# Altium footprint library microbuilder.PCBLIB: 422 footprints (part 5 of 27)
Each footprint in its own frame and in the unit in brackets; x right, y up, seen from the top. Pads: shape width x height; smd on the part's side, far side on the other; paste and mask are expansions set on the pad; w line width, h text height; cw(c..) or ccw(c..) is an arc to the next point about the centre after c.
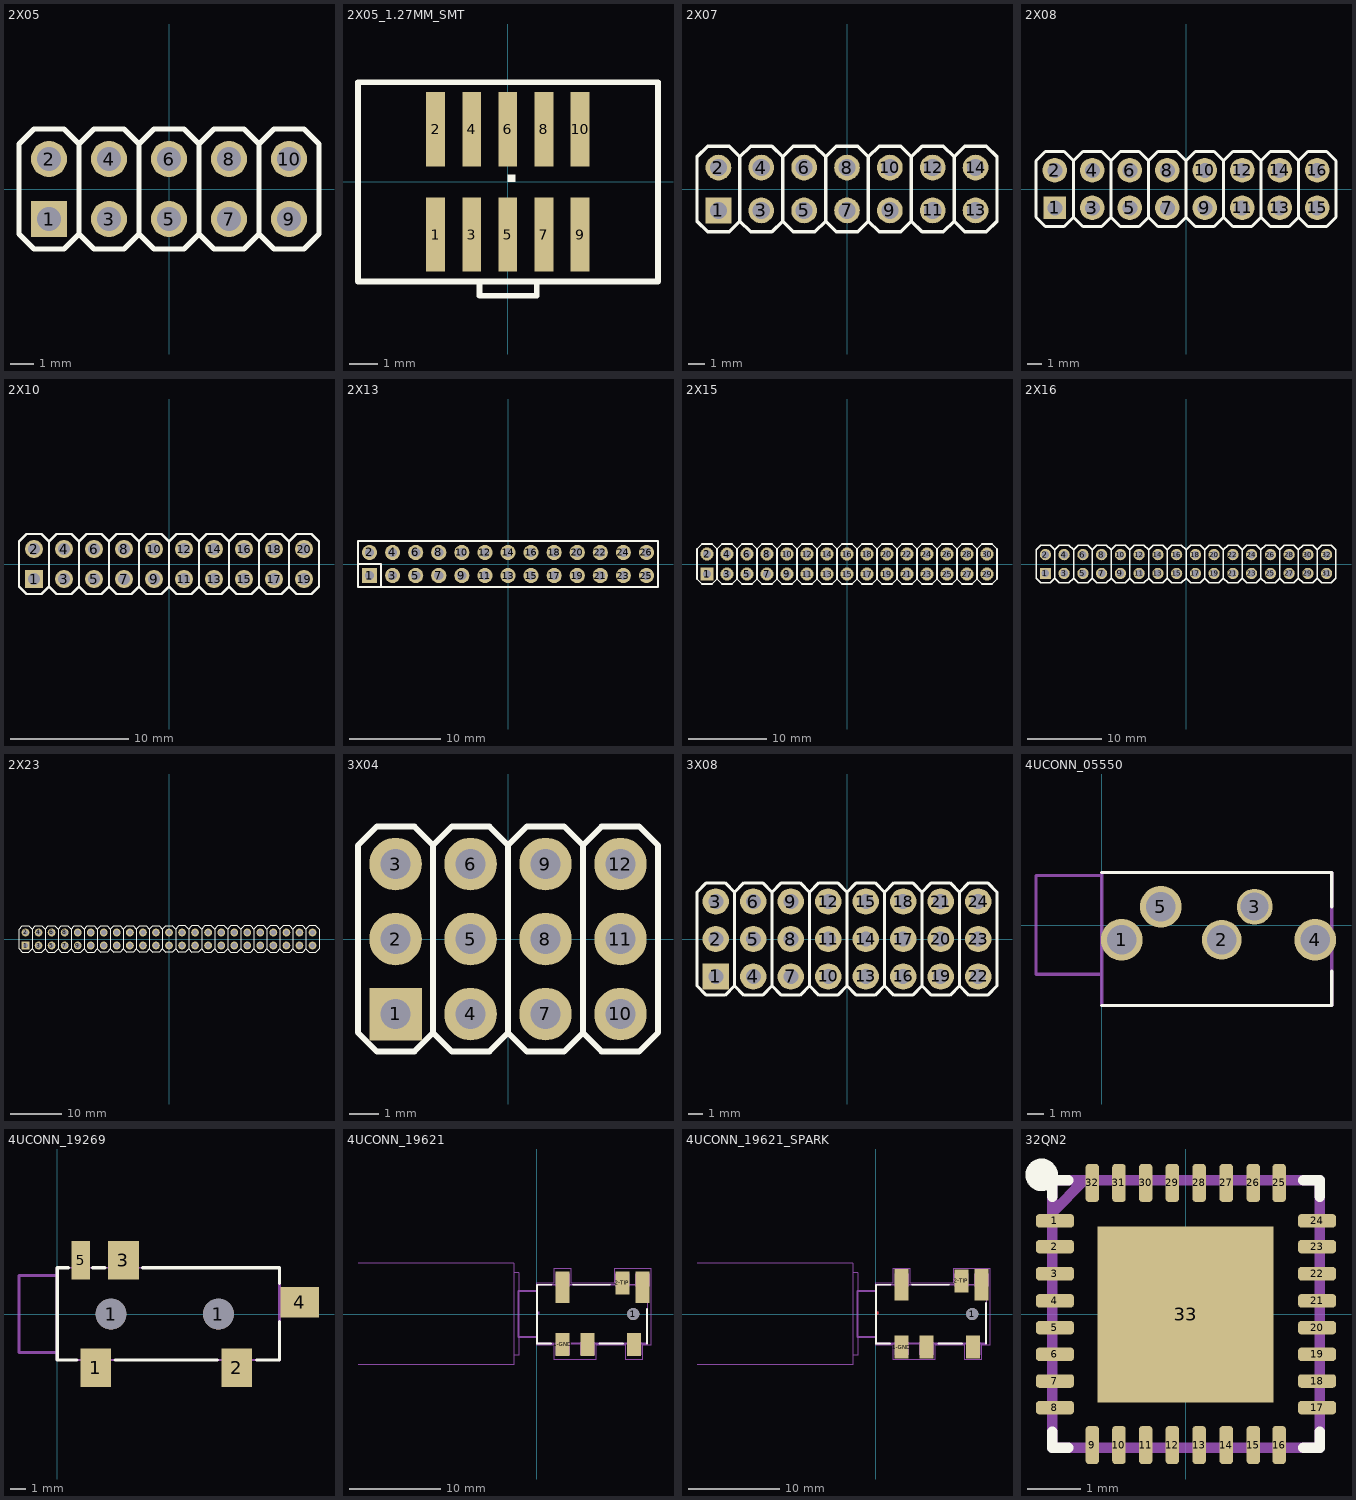
[diagram p4: the footprints below, top view; thin cyan lines are the x and y axes]

## 2X05 [mil]
pads (10):
  rect 60x60 hole 40: 1(-200,-50)
  round 60 hole 40: 2(-200,50) 3(-100,-50) 4(-100,50) 5(0,-50) 6(0,50) 7(100,-50) 8(100,50) 9(200,-50) 10(200,50)
Top Overlay:
  lines w8: -150,-75 -175,-100 -225,-100 -250,-75 -250,75 -225,100 -175,100 -150,75 ; -150,-75 -125,-100 -75,-100 -50,-75 ; -150,-75 -150,75 ; -150,75 -125,100 -75,100 -50,75 ; -50,-75 -25,-100 25,-100 50,-75 ; -50,-75 -50,75 ; -50,75 -25,100 25,100 50,75 ; 50,-75 75,-100 125,-100 150,-75 ; 50,-75 50,75 ; 50,75 75,100 125,100 150,75 ; 150,-75 150,75 ; 150,-75 175,-100 225,-100 250,-75 250,75 225,100 175,100 150,75
Mechanical 16:
  rectangle: -210,-60 -190,-40
  rectangle: -210,40 -190,60
  rectangle: -110,40 -90,60
  rectangle: -110,-60 -90,-40
  rectangle: -10,40 10,60
  rectangle: -10,-60 10,-40
  rectangle: 90,40 110,60
  rectangle: 90,-60 110,-40
  rectangle: 190,40 210,60
  rectangle: 190,-60 210,-40

## 2X05_1.27MM_SMT [mil]
pads (10):
  rect 26x103 smd: 1(-100,-72.83) 2(-100,73) 3(-50,-72.83) 4(-50,73) 5(0,-72.83) 6(0,73) 7(50,-72.83) 8(50,73) 9(100,-72.83) 10(100,73)
Top Overlay:
  region: 0,0 10,0 10,10 0,10
  lines w8: -39.37,-137.8 40,-137.8 ; -39.37,-137.8 -207.48,-137.8 -207.48,138 208,138 208,-137.8 40,-137.8 ; -39.37,-137.8 -39.37,-157.48 40,-157.48 40,-137.8

## 2X07 [mil]
pads (14):
  rect 60x60 hole 40: 1(-300,-50)
  round 60 hole 40: 2(-300,50) 3(-200,-50) 4(-200,50) 5(-100,-50) 6(-100,50) 7(0,-50) 8(0,50) 9(100,-50) 10(100,50) 11(200,-50) 12(200,50) 13(300,-50) 14(300,50)
Top Overlay:
  lines w8: -250,-75 -275,-100 -325,-100 -350,-75 -350,75 -325,100 -275,100 -250,75 ; -250,-75 -225,-100 -175,-100 -150,-75 ; -250,-75 -250,75 ; -250,75 -225,100 -175,100 -150,75 ; -150,-75 -125,-100 -75,-100 -50,-75 ; -150,-75 -150,75 ; -150,75 -125,100 -75,100 -50,75 ; -50,-75 -25,-100 25,-100 50,-75 ; -50,-75 -50,75 ; -50,75 -25,100 25,100 50,75 ; 50,-75 75,-100 125,-100 150,-75 ; 50,-75 50,75 ; 50,75 75,100 125,100 150,75 ; 150,-75 175,-100 225,-100 250,-75 ; 150,-75 150,75 ; 150,75 175,100 225,100 250,75 ; 250,-75 250,75 ; 250,-75 275,-100 325,-100 350,-75 350,75 325,100 275,100 250,75
Mechanical 16:
  rectangle: -310,-60 -290,-40
  rectangle: -310,40 -290,60
  rectangle: -210,40 -190,60
  rectangle: -210,-60 -190,-40
  rectangle: -110,40 -90,60
  rectangle: -110,-60 -90,-40
  rectangle: -10,40 10,60
  rectangle: 90,40 110,60
  rectangle: 190,40 210,60
  rectangle: -10,-60 10,-40
  rectangle: 90,-60 110,-40
  rectangle: 190,-60 210,-40
  rectangle: 290,40 310,60
  rectangle: 290,-60 310,-40

## 2X08 [mil]
pads (16):
  rect 60x60 hole 40: 1(-350,-50)
  round 66 hole 40: 2(-350,50) 3(-250,-50) 4(-250,50) 5(-150,-50) 6(-150,50) 7(-50,-50) 8(-50,50) 9(50,-50) 10(50,50) 11(150,-50) 12(150,50) 13(250,-50) 14(250,50) 15(350,-50) 16(350,50)
Top Overlay:
  lines w8: -300,-75 -325,-100 -375,-100 -400,-75 -400,75 -375,100 -325,100 -300,75 ; -300,-75 -275,-100 -225,-100 -200,-75 ; -300,-75 -300,75 ; -300,75 -275,100 -225,100 -200,75 ; -200,-75 -175,-100 -125,-100 -100,-75 ; -200,-75 -200,75 ; -200,75 -175,100 -125,100 -100,75 ; -100,-75 -75,-100 -25,-100 0,-75 ; -100,-75 -100,75 ; -100,75 -75,100 -25,100 0,75 ; 0,-75 25,-100 75,-100 100,-75 ; 0,-75 0,75 ; 0,75 25,100 75,100 100,75 ; 100,-75 125,-100 175,-100 200,-75 ; 100,-75 100,75 ; 100,75 125,100 175,100 200,75 ; 200,-75 200,75 ; 200,-75 225,-100 275,-100 300,-75 ; 200,75 225,100 275,100 300,75 ; 300,-75 300,75 ; 300,-75 325,-100 375,-100 400,-75 400,75 375,100 325,100 300,75
Mechanical 16:
  rectangle: -360,-60 -340,-40
  rectangle: -360,40 -340,60
  rectangle: -260,40 -240,60
  rectangle: -260,-60 -240,-40
  rectangle: -160,40 -140,60
  rectangle: -160,-60 -140,-40
  rectangle: -60,40 -40,60
  rectangle: 40,40 60,60
  rectangle: 140,40 160,60
  rectangle: -60,-60 -40,-40
  rectangle: 40,-60 60,-40
  rectangle: 140,-60 160,-40
  rectangle: 240,40 260,60
  rectangle: 240,-60 260,-40
  rectangle: 340,40 360,60
  rectangle: 340,-60 360,-40

## 2X10 [mil]
pads (20):
  rect 60x60 hole 40: 1(-450,-50)
  round 60 hole 40: 2(-450,50) 3(-350,-50) 4(-350,50) 5(-250,-50) 6(-250,50) 7(-150,-50) 8(-150,50) 9(-50,-50) 10(-50,50) 11(50,-50) 12(50,50) 13(150,-50) 14(150,50) 15(250,-50) 16(250,50) 17(350,-50) 18(350,50) 19(450,-50) 20(450,50)
Top Overlay:
  lines w8: -400,-75 -425,-100 -475,-100 -500,-75 -500,75 -475,100 -425,100 -400,75 ; -400,-75 -375,-100 -325,-100 -300,-75 ; -400,-75 -400,75 ; -400,75 -375,100 -325,100 -300,75 ; -300,-75 -275,-100 -225,-100 -200,-75 ; -300,-75 -300,75 ; -300,75 -275,100 -225,100 -200,75 ; -200,-75 -175,-100 -125,-100 -100,-75 ; -200,-75 -200,75 ; -200,75 -175,100 -125,100 -100,75 ; -100,-75 -75,-100 -25,-100 0,-75 ; -100,-75 -100,75 ; -100,75 -75,100 -25,100 0,75 ; 0,-75 25,-100 75,-100 100,-75 ; 0,-75 0,75 ; 0,75 25,100 75,100 100,75 ; 100,-75 125,-100 175,-100 200,-75 ; 100,-75 100,75 ; 100,75 125,100 175,100 200,75 ; 200,-75 225,-100 275,-100 300,-75 ; 200,-75 200,75 ; 200,75 225,100 275,100 300,75 ; 300,-75 325,-100 375,-100 400,-75 ; 300,-75 300,75 ; 300,75 325,100 375,100 400,75 ; 400,-75 400,75 ; 400,-75 425,-100 475,-100 500,-75 500,75 475,100 425,100 400,75
Mechanical 16:
  rectangle: -460,-60 -440,-40
  rectangle: -460,40 -440,60
  rectangle: -360,40 -340,60
  rectangle: -360,-60 -340,-40
  rectangle: -260,40 -240,60
  rectangle: -260,-60 -240,-40
  rectangle: -160,40 -140,60
  rectangle: -60,40 -40,60
  rectangle: 40,40 60,60
  rectangle: -160,-60 -140,-40
  rectangle: -60,-60 -40,-40
  rectangle: 40,-60 60,-40
  rectangle: 140,40 160,60
  rectangle: 140,-60 160,-40
  rectangle: 240,40 260,60
  rectangle: 240,-60 260,-40
  rectangle: 340,40 360,60
  rectangle: 340,-60 360,-40
  rectangle: 440,40 460,60
  rectangle: 440,-60 460,-40

## 2X13 [mil]
pads (26):
  rect 66x66 hole 40: 1(-600,-50)
  round 66 hole 40: 2(-600,50) 3(-500,-50) 4(-500,50) 5(-400,-50) 6(-400,50) 7(-300,-50) 8(-300,50) 9(-200,-50) 10(-200,50) 11(-100,-50) 12(-100,50) 13(0,-50) 14(0,50) 15(100,-50) 16(100,50) 17(200,-50) 18(200,50) 19(300,-50) 20(300,50) 21(400,-50) 22(400,50) 23(500,-50) 24(500,50) 25(600,-50) 26(600,50)
Top Overlay:
  lines w8: -650,0 -650,-100 -550,-100 ; -650,0 -650,100 650,100 650,-100 -550,-100 ; -650,0 -550,0 -550,-100
Mechanical 16:
  rectangle: -610,-60 -590,-40
  rectangle: -610,40 -590,60
  rectangle: -510,40 -490,60
  rectangle: -510,-60 -490,-40
  rectangle: -410,40 -390,60
  rectangle: -410,-60 -390,-40
  rectangle: -310,40 -290,60
  rectangle: -210,40 -190,60
  rectangle: -110,40 -90,60
  rectangle: -310,-60 -290,-40
  rectangle: -210,-60 -190,-40
  rectangle: -110,-60 -90,-40
  rectangle: -10,40 10,60
  rectangle: -10,-60 10,-40
  rectangle: 90,40 110,60
  rectangle: 90,-60 110,-40
  rectangle: 190,40 210,60
  rectangle: 190,-60 210,-40
  rectangle: 290,40 310,60
  rectangle: 290,-60 310,-40
  rectangle: 390,40 410,60
  rectangle: 390,-60 410,-40
  rectangle: 490,40 510,60
  rectangle: 490,-60 510,-40
  rectangle: 590,40 610,60
  rectangle: 590,-60 610,-40

## 2X15 [mil]
pads (30):
  rect 66x66 hole 40: 1(-700,-50)
  round 66 hole 40: 2(-700,50) 3(-600,-50) 4(-600,50) 5(-500,-50) 6(-500,50) 7(-400,-50) 8(-400,50) 9(-300,-50) 10(-300,50) 11(-200,-50) 12(-200,50) 13(-100,-50) 14(-100,50) 15(0,-50) 16(0,50) 17(100,-50) 18(100,50) 19(200,-50) 20(200,50) 21(300,-50) 22(300,50) 23(400,-50) 24(400,50) 25(500,-50) 26(500,50) 27(600,-50) 28(600,50) 29(700,-50) 30(700,50)
Top Overlay:
  lines w8: -650,-75 -675,-100 -725,-100 -750,-75 -750,75 -725,100 -675,100 -650,75 ; -650,-75 -625,-100 -575,-100 -550,-75 ; -650,-75 -650,75 ; -650,75 -625,100 -575,100 -550,75 ; -550,-75 -525,-100 -475,-100 -450,-75 ; -550,-75 -550,75 ; -550,75 -525,100 -475,100 -450,75 ; -450,-75 -425,-100 -375,-100 -350,-75 ; -450,-75 -450,75 ; -450,75 -425,100 -375,100 -350,75 ; -350,-75 -325,-100 -275,-100 -250,-75 ; -350,-75 -350,75 ; -350,75 -325,100 -275,100 -250,75 ; -250,-75 -225,-100 -175,-100 -150,-75 ; -250,-75 -250,75 ; -250,75 -225,100 -175,100 -150,75 ; -150,-75 -125,-100 -75,-100 -50,-75 ; -150,-75 -150,75 ; -150,75 -125,100 -75,100 -50,75 ; -50,-75 -25,-100 25,-100 50,-75 ; -50,-75 -50,75 ; -50,75 -25,100 25,100 50,75 ; 50,-75 75,-100 125,-100 150,-75 ; 50,-75 50,75 ; 50,75 75,100 125,100 150,75 ; 150,-75 175,-100 225,-100 250,-75 ; 150,-75 150,75 ; 150,75 175,100 225,100 250,75 ; 250,-75 275,-100 325,-100 350,-75 ; 250,-75 250,75 ; 250,75 275,100 325,100 350,75 ; 350,-75 375,-100 425,-100 450,-75 ; 350,-75 350,75 ; 350,75 375,100 425,100 450,75 ; 450,-75 475,-100 525,-100 550,-75 ; 450,-75 450,75 ; 450,75 475,100 525,100 550,75 ; 550,-75 575,-100 625,-100 650,-75 ; 550,-75 550,75 ; 550,75 575,100 625,100 650,75 ; 650,-75 675,-100 725,-100 750,-75 750,75 725,100 675,100 650,75 ; 650,-75 650,75
Mechanical 16:
  rectangle: -710,-60 -690,-40
  rectangle: -710,40 -690,60
  rectangle: -610,40 -590,60
  rectangle: -610,-60 -590,-40
  rectangle: -510,40 -490,60
  rectangle: -510,-60 -490,-40
  rectangle: -410,40 -390,60
  rectangle: -310,40 -290,60
  rectangle: -210,40 -190,60
  rectangle: -410,-60 -390,-40
  rectangle: -310,-60 -290,-40
  rectangle: -210,-60 -190,-40
  rectangle: -110,40 -90,60
  rectangle: -110,-60 -90,-40
  rectangle: -10,40 10,60
  rectangle: -10,-60 10,-40
  rectangle: 90,40 110,60
  rectangle: 90,-60 110,-40
  rectangle: 190,40 210,60
  rectangle: 190,-60 210,-40
  rectangle: 290,40 310,60
  rectangle: 290,-60 310,-40
  rectangle: 390,40 410,60
  rectangle: 390,-60 410,-40
  rectangle: 490,40 510,60
  rectangle: 490,-60 510,-40
  rectangle: 590,40 610,60
  rectangle: 590,-60 610,-40
  rectangle: 690,40 710,60
  rectangle: 690,-60 710,-40

## 2X16 [mil]
pads (32):
  rect 60x60 hole 40: 1(-750,-50)
  round 60 hole 40: 2(-750,50) 3(-650,-50) 4(-650,50) 5(-550,-50) 6(-550,50) 7(-450,-50) 8(-450,50) 9(-350,-50) 10(-350,50) 11(-250,-50) 12(-250,50) 13(-150,-50) 14(-150,50) 15(-50,-50) 16(-50,50) 17(50,-50) 18(50,50) 19(150,-50) 20(150,50) 21(250,-50) 22(250,50) 23(350,-50) 24(350,50) 25(450,-50) 26(450,50) 27(550,-50) 28(550,50) 29(650,-50) 30(650,50) 31(750,-50) 32(750,50)
Top Overlay:
  lines w8: -700,-75 -725,-100 -775,-100 -800,-75 -800,75 -775,100 -725,100 -700,75 ; -700,-75 -675,-100 -625,-100 -600,-75 ; -700,-75 -700,75 ; -700,75 -675,100 -625,100 -600,75 ; -600,-75 -575,-100 -525,-100 -500,-75 ; -600,-75 -600,75 ; -600,75 -575,100 -525,100 -500,75 ; -500,-75 -475,-100 -425,-100 -400,-75 ; -500,-75 -500,75 ; -500,75 -475,100 -425,100 -400,75 ; -400,-75 -375,-100 -325,-100 -300,-75 ; -400,-75 -400,75 ; -400,75 -375,100 -325,100 -300,75 ; -300,-75 -275,-100 -225,-100 -200,-75 ; -300,-75 -300,75 ; -300,75 -275,100 -225,100 -200,75 ; -200,-75 -175,-100 -125,-100 -100,-75 ; -200,-75 -200,75 ; -200,75 -175,100 -125,100 -100,75 ; -100,-75 -75,-100 -25,-100 0,-75 ; -100,-75 -100,75 ; -100,75 -75,100 -25,100 0,75 ; 0,-75 25,-100 75,-100 100,-75 ; 0,-75 0,75 ; 0,75 25,100 75,100 100,75 ; 100,-75 125,-100 175,-100 200,-75 ; 100,-75 100,75 ; 100,75 125,100 175,100 200,75 ; 200,-75 225,-100 275,-100 300,-75 ; 200,-75 200,75 ; 200,75 225,100 275,100 300,75 ; 300,-75 325,-100 375,-100 400,-75 ; 300,-75 300,75 ; 300,75 325,100 375,100 400,75 ; 400,-75 425,-100 475,-100 500,-75 ; 400,-75 400,75 ; 400,75 425,100 475,100 500,75 ; 500,-75 525,-100 575,-100 600,-75 ; 500,-75 500,75 ; 500,75 525,100 575,100 600,75 ; 600,-75 625,-100 675,-100 700,-75 ; 600,-75 600,75 ; 600,75 625,100 675,100 700,75 ; 700,-75 725,-100 775,-100 800,-75 800,75 775,100 725,100 700,75 ; 700,-75 700,75
Mechanical 16:
  rectangle: -760,-60 -740,-40
  rectangle: -760,40 -740,60
  rectangle: -660,40 -640,60
  rectangle: -660,-60 -640,-40
  rectangle: -560,40 -540,60
  rectangle: -560,-60 -540,-40
  rectangle: -460,40 -440,60
  rectangle: -360,40 -340,60
  rectangle: -260,40 -240,60
  rectangle: -460,-60 -440,-40
  rectangle: -360,-60 -340,-40
  rectangle: -260,-60 -240,-40
  rectangle: -160,40 -140,60
  rectangle: -160,-60 -140,-40
  rectangle: -60,40 -40,60
  rectangle: -60,-60 -40,-40
  rectangle: 40,40 60,60
  rectangle: 40,-60 60,-40
  rectangle: 140,40 160,60
  rectangle: 140,-60 160,-40
  rectangle: 240,40 260,60
  rectangle: 240,-60 260,-40
  rectangle: 340,40 360,60
  rectangle: 340,-60 360,-40
  rectangle: 440,40 460,60
  rectangle: 440,-60 460,-40
  rectangle: 540,40 560,60
  rectangle: 540,-60 560,-40
  rectangle: 640,40 660,60
  rectangle: 640,-60 660,-40
  rectangle: 740,40 760,60
  rectangle: 740,-60 760,-40

## 2X23 [mil]
pads (46):
  rect 60x60 hole 40: 1(-1100,-50)
  round 60 hole 40: 2(-1100,50) 3(-1000,-50) 4(-1000,50) 5(-900,-50) 6(-900,50) 7(-800,-50) 8(-800,50) 9(-700,-50) 10(-700,50) 11(-600,-50) 12(-600,50) 13(-500,-50) 14(-500,50) 15(-400,-50) 16(-400,50) 17(-300,-50) 18(-300,50) 19(-200,-50) 20(-200,50) 21(-100,-50) 22(-100,50) 23(0,-50) 24(0,50) 25(100,-50) 26(100,50) 27(200,-50) 28(200,50) 29(300,-50) 30(300,50) 31(400,-50) 32(400,50) 33(500,-50) 34(500,50) 35(600,-50) 36(600,50) 37(700,-50) 38(700,50) 39(800,-50) 40(800,50) 41(900,-50) 42(900,50) 43(1000,-50) 44(1000,50) 45(1100,-50) 46(1100,50)
Top Overlay:
  drawing of 162 lines, arcs and shapes, not listed
Mechanical 16:
  rectangle: -1110,-60 -1090,-40
  rectangle: -1110,40 -1090,60
  rectangle: -1010,40 -990,60
  rectangle: -1010,-60 -990,-40
  rectangle: -910,40 -890,60
  rectangle: -910,-60 -890,-40
  rectangle: -810,40 -790,60
  rectangle: -710,40 -690,60
  rectangle: -610,40 -590,60
  rectangle: -810,-60 -790,-40
  rectangle: -710,-60 -690,-40
  rectangle: -610,-60 -590,-40
  rectangle: -510,40 -490,60
  rectangle: -510,-60 -490,-40
  rectangle: -410,40 -390,60
  rectangle: -410,-60 -390,-40
  rectangle: -310,40 -290,60
  rectangle: -310,-60 -290,-40
  rectangle: -210,40 -190,60
  rectangle: -210,-60 -190,-40
  rectangle: -110,40 -90,60
  rectangle: -110,-60 -90,-40
  rectangle: -10,40 10,60
  rectangle: -10,-60 10,-40
  rectangle: 90,40 110,60
  rectangle: 90,-60 110,-40
  rectangle: 190,40 210,60
  rectangle: 190,-60 210,-40
  rectangle: 290,40 310,60
  rectangle: 290,-60 310,-40
  rectangle: 390,40 410,60
  rectangle: 390,-60 410,-40
  rectangle: 490,40 510,60
  rectangle: 490,-60 510,-40
  rectangle: 590,40 610,60
  rectangle: 590,-60 610,-40
  rectangle: 690,40 710,60
  rectangle: 690,-60 710,-40
  rectangle: 790,40 810,60
  rectangle: 790,-60 810,-40
  rectangle: 890,40 910,60
  rectangle: 890,-60 910,-40
  rectangle: 990,40 1010,60
  rectangle: 990,-60 1010,-40
  rectangle: 1090,40 1110,60
  rectangle: 1090,-60 1110,-40

## 3X04 [mil]
pads (12):
  rect 70x70 hole 40: 1(-150,-100)
  round 70 hole 40: 2(-150,0) 3(-150,100) 4(-50,-100) 5(-50,0) 6(-50,100) 7(50,-100) 8(50,0) 9(50,100) 10(150,-100) 11(150,0) 12(150,100)
Top Overlay:
  lines w8: -100,-125 -125,-150 -175,-150 -200,-125 -200,125 -175,150 -125,150 -100,125 ; -100,-125 -75,-150 -25,-150 0,-125 ; -100,-125 -100,125 ; -100,125 -75,150 -25,150 0,125 ; 0,-125 25,-150 75,-150 100,-125 ; 0,-125 0,125 ; 0,125 25,150 75,150 100,125 ; 100,-125 125,-150 175,-150 200,-125 200,125 175,150 125,150 100,125 ; 100,-125 100,125
Mechanical 16:
  rectangle: -160,-110 -140,-90
  rectangle: -160,-10 -140,10
  rectangle: -60,-10 -40,10
  rectangle: -60,-110 -40,-90
  rectangle: 40,-10 60,10
  rectangle: 40,-110 60,-90
  rectangle: 140,-10 160,10
  rectangle: 140,-110 160,-90
  rectangle: -160,90 -140,110
  rectangle: -60,90 -40,110
  rectangle: 40,90 60,110
  rectangle: 140,90 160,110

## 3X08 [mil]
pads (24):
  rect 70x70 hole 40: 1(-350,-100)
  round 70 hole 40: 2(-350,0) 3(-350,100) 4(-250,-100) 5(-250,0) 6(-250,100) 7(-150,-100) 8(-150,0) 9(-150,100) 10(-50,-100) 11(-50,0) 12(-50,100) 13(50,-100) 14(50,0) 15(50,100) 16(150,-100) 17(150,0) 18(150,100) 19(250,-100) 20(250,0) 21(250,100) 22(350,-100) 23(350,0) 24(350,100)
Top Overlay:
  lines w8: -300,-125 -325,-150 -375,-150 -400,-125 -400,125 -375,150 -325,150 -300,125 ; -300,-125 -275,-150 -225,-150 -200,-125 ; -300,-125 -300,125 ; -300,125 -275,150 -225,150 -200,125 ; -200,-125 -175,-150 -125,-150 -100,-125 ; -200,-125 -200,125 ; -200,125 -175,150 -125,150 -100,125 ; -100,-125 -75,-150 -25,-150 0,-125 ; -100,-125 -100,125 ; -100,125 -75,150 -25,150 0,125 ; 0,-125 25,-150 75,-150 100,-125 ; 0,-125 0,125 ; 0,125 25,150 75,150 100,125 ; 100,-125 125,-150 175,-150 200,-125 ; 100,-125 100,125 ; 100,125 125,150 175,150 200,125 ; 200,-125 200,125 ; 200,-125 225,-150 275,-150 300,-125 ; 200,125 225,150 275,150 300,125 ; 300,-125 300,125 ; 300,-125 325,-150 375,-150 400,-125 400,125 375,150 325,150 300,125
Mechanical 16:
  rectangle: -360,-110 -340,-90
  rectangle: -360,-10 -340,10
  rectangle: -260,-10 -240,10
  rectangle: -260,-110 -240,-90
  rectangle: -160,-10 -140,10
  rectangle: -160,-110 -140,-90
  rectangle: -60,-10 -40,10
  rectangle: 40,-10 60,10
  rectangle: 140,-10 160,10
  rectangle: -60,-110 -40,-90
  rectangle: 40,-110 60,-90
  rectangle: 140,-110 160,-90
  rectangle: 240,-10 260,10
  rectangle: 240,-110 260,-90
  rectangle: 340,-10 360,10
  rectangle: 340,-110 360,-90
  rectangle: -360,90 -340,110
  rectangle: -260,90 -240,110
  rectangle: -160,90 -140,110
  rectangle: -60,90 -40,110
  rectangle: 40,90 60,110
  rectangle: 140,90 160,110
  rectangle: 240,90 260,110
  rectangle: 340,90 360,110

## 4UCONN_05550 [mil]
pads (5):
  round 100 hole 71: 1(48,-35.43) 4(512,-35.43) 5(142,44)
  round 95 hole 71: 2(288,-35.43)
  round 86 hole 67: 3(367,44)
Top Overlay:
  lines w8: 0,-192.91 552,-192.91 552,-110.24 ; 0,126 552,126 552,44
Mechanical 16:
  lines w5: 0,-192.91 552,-192.91 ; 0,126 552,126
  lines w8: 0,-192.91 0,-118.11 ; 0,126 0,119 ; 552,-192.91 552,126 ; 0,-118.11 0,119 ; 0,-118.11 -157.48,-118.11 -157.48,119 0,119

## 4UCONN_19269 [mil]
pads (7):
  rect 79x99 smd: 1(99,-137.8) 2(461,-137.8) 3(170,138)
  round 79 hole 79: 1(138,0) 1(414,0)
  rect 99x79 smd: 4(623,30)
  rect 48x99 smd: 5(60,138)
Top Overlay:
  lines w8: 0,-118.11 0,119 28,119 ; 2,-118.11 50,-118.11 ; 91,119 123,119 ; 148,-118.11 412,-118.11 ; 219,119 571,119 571,79 ; 512,-118.11 571,-118.11 571,-19.68
Mechanical 16:
  rectangle: 138,119 201,174
  rectangle: 67,-175.2 130,-120.08
  rectangle: 430,-175.2 493,-120.08
  region: 628.5,-1.5 628.5,61.5 572.5,61.5 572.5,-1.5
  rectangle: 42,119 77,174
  lines w5: 0,-118.11 571,-118.11 ; 0,119 571,119
  lines w8: 0,-118.11 0,-98.43 ; 0,117 0,99 ; 571,-118.11 571,119 ; 0,-98.43 0,99 ; 0,-98.43 -98.43,-98.43 -98.43,99 0,99

## 4UCONN_19621 [mil]
pads (7):
  round 52 hole 52: 1(414,0)
  rect 60x99 smd: 1-GND(111,-129.92) 2-TIP(367,134) 3-OUTER_SLEEVE(217,-129.92) 6-OUTER_SLEEVE_BREAK(418,-129.92)
  rect 60x134 smd: 4-INNER_SLEEVE(111,115) 5-TIP_BREAK(453,115)
Top Overlay:
  lines w8: 60,-125.98 0,-125.98 0,126 63,126 ; 154,126 315,126 ; 268,-125.98 371,-125.98 ; 473,-125.98 473,22
Mechanical 16:
  rectangle: 79,119 142,174
  rectangle: 79,-175.2 142,-120.08
  rectangle: 386,-175.2 449,-120.08
  rectangle: 186,-175.2 249,-120.08
  rectangle: 335,119 398,174
  rectangle: 422,119 485,174
  lines w5: 0,-125.98 0,-98.43 0,99 ; 473,-125.98 473,126
  lines w8: 0,-125.98 473,-125.98 ; 0,-98.43 -78.74,-98.43 -78.74,99 0,99 0,126 473,126
Mechanical 27:
  region: 0,0 10,0 10,10 0,10
  lines w2: -78.74,-98.43 0,-98.43 0,-133.86 75,-133.86 75,-196.85 252,-196.85 252,-133.86 382,-133.86 382,-196.85 453,-196.85 453,-133.86 489,-133.86 489,197 335,197 335,134 146,134 146,197 75,197 75,134 0,134 0,99 -78.74,99 -78.74,-98.43
Mech43:
  lines w5: -767.72,-216.54 -98.43,-216.54 -98.43,-177.17 ; -767.72,217 -98.43,217 -98.43,178 ; -98.43,-177.17 -98.43,178 ; -98.43,-177.17 -78.74,-177.17 -78.74,178 -98.43,178

## 4UCONN_19621_SPARK [mil]
pads (7):
  round 52 hole 52: 1(414,0)
  rect 60x99 smd: 1-GND(111,-141.73) 2-TIP(367,142) 3-OUTER_SLEEVE(217,-141.73) 6-OUTER_SLEEVE_BREAK(418,-141.73)
  rect 60x134 smd: 4-INNER_SLEEVE(111,126) 5-TIP_BREAK(453,126)
Top Layer:
  region: 0,0 10,0 10,10 0,10
  region: 0,0 10,0 10,10 0,10
  region: 0,0 10,0 10,10 0,10
  region: 0,0 10,0 10,10 0,10
  region: 0,0 10,0 10,10 0,10
  region: 0,0 10,0 10,10 0,10
  region: 0,0 10,0 10,10 0,10
  region: 0,0 10,0 10,10 0,10
  region: 0,0 10,0 10,10 0,10
  region: 0,0 10,0 10,10 0,10
  region: 0,0 10,0 10,10 0,10
Top Overlay:
  lines w8: 60,-125.98 0,-125.98 0,126 63,126 ; 154,126 315,126 ; 268,-125.98 371,-125.98 ; 473,-125.98 473,48
Top Solder:
  region: 0,0 10,0 10,10 0,10
  region: 0,0 10,0 10,10 0,10
  region: 0,0 10,0 10,10 0,10
Mechanical 16:
  rectangle: 79,119 142,174
  rectangle: 79,-175.2 142,-120.08
  rectangle: 386,-175.2 449,-120.08
  rectangle: 186,-175.2 249,-120.08
  rectangle: 335,119 398,174
  rectangle: 422,119 485,174
  lines w5: 0,-125.98 0,-98.43 0,99 ; 473,-125.98 473,126
  lines w8: 0,-125.98 473,-125.98 ; 0,-98.43 -78.74,-98.43 -78.74,99 0,99 0,126 473,126
Mechanical 27:
  region: 0,0 10,0 10,10 0,10
  lines w2: -78.74,-98.43 0,-98.43 0,-133.86 75,-133.86 75,-196.85 252,-196.85 252,-133.86 382,-133.86 382,-196.85 453,-196.85 453,-133.86 489,-133.86 489,197 335,197 335,134 146,134 146,197 75,197 75,134 0,134 0,99 -78.74,99 -78.74,-98.43
Mech43:
  lines w5: -767.72,-216.54 -98.43,-216.54 -98.43,-177.17 ; -767.72,217 -98.43,217 -98.43,178 ; -98.43,-177.17 -98.43,178 ; -98.43,-177.17 -78.74,-177.17 -78.74,178 -98.43,178

## 32QN2 [mil]
pads (33):
  rrect50% 28x10 smd: 1(-96.46,69) 2(-96.46,50) 3(-96.46,30) 4(-96.46,10) 5(-96.46,-9.84) 6(-96.46,-29.53) 7(-96.46,-49.21) 8(-96.46,-68.9) 17(97,-68.9) 18(97,-49.21) 19(97,-29.53) 20(97,-9.84) 21(97,10) 22(97,30) 23(97,50) 24(97,69)
  rrect50% 10x28 smd: 9(-68.9,-96.46) 10(-49.21,-96.46) 11(-29.53,-96.46) 12(-9.84,-96.46) 13(10,-96.46) 14(30,-96.46) 15(50,-96.46) 16(69,-96.46) 25(69,97) 26(50,97) 27(30,97) 28(10,97) 29(-9.84,97) 30(-29.53,97) 31(-49.21,97) 32(-68.9,97)
  rect 130x130 smd: 33(0,0)
Top Overlay:
  circle w16: c-106.3,103 r4
  lines w8: -98.43,-86.61 -98.43,-98.43 -86.61,-98.43 ; -98.43,87 -98.43,99 -86.61,99 ; 87,-98.43 99,-98.43 99,-86.61 ; 87,99 99,99 99,87
Top Paste:
  rectangle: -59.06,36 -35.43,60
  rectangle: -27.56,36 -3.94,60
  rectangle: 4,36 28,60
  rectangle: 36,36 60,60
  rectangle: -59.06,4 -35.43,28
  rectangle: -59.06,-27.56 -35.43,-3.94
  rectangle: -59.06,-59.06 -35.43,-35.43
  rectangle: -27.56,-59.06 -3.94,-35.43
  rectangle: -27.56,-27.56 -3.94,-3.94
  rectangle: -27.56,4 -3.94,28
  rectangle: 4,4 28,28
  rectangle: 4,-27.56 28,-3.94
  rectangle: 4,-59.06 28,-35.43
  rectangle: 36,-59.06 60,-35.43
  rectangle: 36,-27.56 60,-3.94
  rectangle: 36,4 60,28
Mechanical 16:
  lines w8: -98.43,75 -98.43,-98.43 99,-98.43 99,99 -74.8,99 ; -98.43,75 -98.43,99 -74.8,99 ; -98.43,75 -74.8,99